# Altium footprint library 3D封装库.PcbLib: 716 footprints (part 38 of 45)
Each footprint in its own frame and in the unit in brackets; x right, y up, seen from the top. Pads: shape width x height; smd on the part's side, far side on the other; paste and mask are expansions set on the pad; w line width, h text height; cw(c..) or ccw(c..) is an arc to the next point about the centre after c.
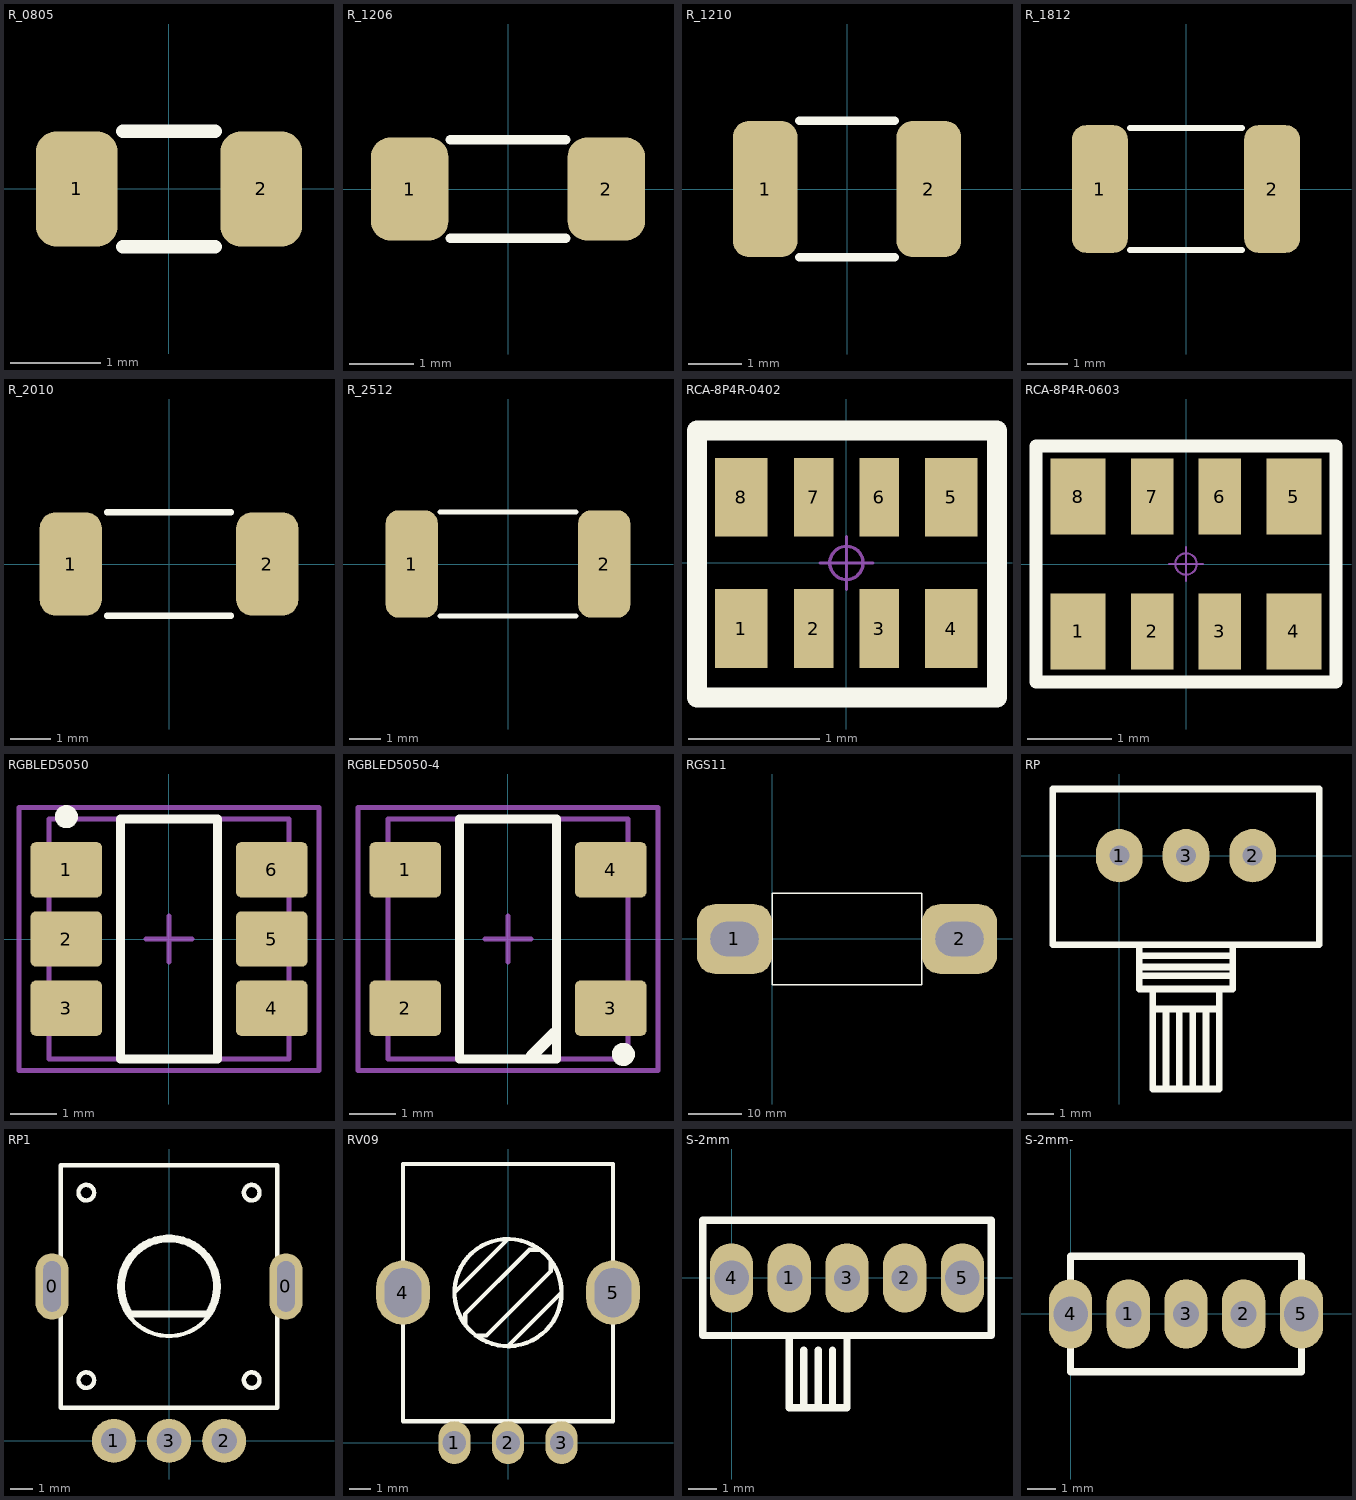
[diagram p37: the footprints below, top view; thin cyan lines are the x and y axes]

## R_0805 [mm]
pads (2):
  rrect50% 0.9x1.27 smd: 1(-1.016,0) 2(1.016,0)
Top Overlay:
  lines w0.152: -0.508,-0.635 0.508,-0.635 ; -0.508,0.635 0.508,0.635
3D body "R 0805.STEP": height 0.5, standoff -0.01, extent -1,-0.625 1,0.625

## R_1206 [mil]
pads (2):
  rrect50% 47.24x63 smd: 1(-60,0) 2(60,0)
Top Overlay:
  lines w6: -35,-30 35,-30 ; -35,30 35,30
3D body "R 1206.STEP": height 21.69, standoff -0.24, extent -62.99,-31.49 63,31.5

## R_1210 [mm]
pads (2):
  rrect50% 1.2x2.54 smd: 1(-1.524,0) 2(1.524,0)
Top Overlay:
  lines w0.152: -0.889,-1.27 0.889,-1.27 ; -0.889,1.27 0.889,1.27
3D body "R 1210.STEP": height 0.55, standoff -0.01, extent -1.6,-1.25 1.6,1.25

## R_1812 [mm]
pads (2):
  rrect50% 1.4x3.2 smd: 1(-2.159,0) 2(2.159,0)
Top Overlay:
  lines w0.152: -1.397,-1.524 1.397,-1.524 ; -1.397,1.524 1.397,1.524
3D body "R 1812.STEP": height 0.55, standoff -0.01, extent -2.25,-1.6 2.25,1.6

## R_2010 [mil]
pads (2):
  rrect50% 60x100 smd: 1(-95,0) 2(95,0)
Top Overlay:
  lines w6: -60,-50 60,-50 ; -60,50 60,50
3D body "R 2010.STEP": height 21.69, standoff -0.47, extent -98.42,-49.21 98.43,49.22

## R_2512 [mil]
pads (2):
  rrect50% 65x134 smd: 1(-120,0) 2(120,0)
Top Overlay:
  lines w6: -85,-65 85,-65 ; -85,65 85,65
3D body "R 2512.STEP": height 21.69, standoff -0.63, extent -125.98,-62.99 125.99,63

## RCA-8P4R-0402 [mm] "2mm*1mm*0.45mm(长*宽*厚)"
pads (8):
  rect 0.4x0.6 smd: 1(-0.8,-0.5) 4(0.8,-0.5) 5(0.8,0.5) 8(-0.8,0.5)
  rect 0.3x0.6 smd: 2(-0.25,-0.5) 3(0.25,-0.5) 6(0.25,0.5) 7(-0.25,0.5)
Top Overlay:
  lines w0.152: -1.139,-1.024 1.147,-1.024 1.147,1.008 -1.139,1.008 -1.139,-1.024
Mechanical 15:
  circle w0.025: c0,0 r0.127
  lines w0.025: -0.2,0 0.2,0 ; 0,-0.2 0,0.2
3D body "RCA-8P4R-0402.STEP": height 0.45, standoff 0, extent -1,-0.5 1,0.5

## RCA-8P4R-0603 [mm] "3.2mm*1.6mm*0.6mm(长*宽*厚)"
pads (8):
  rect 0.65x0.9 smd: 1(-1.28,-0.8) 4(1.28,-0.8) 5(1.28,0.8) 8(-1.28,0.8)
  rect 0.5x0.9 smd: 2(-0.4,-0.8) 3(0.4,-0.8) 6(0.4,0.8) 7(-0.4,0.8)
Top Overlay:
  lines w0.152: -1.778,-1.397 -1.778,1.397 1.778,1.397 1.778,-1.397 -1.778,-1.397
Mechanical 15:
  circle w0.025: c0,0 r0.127
  lines w0.025: -0.2,0 0.2,0 ; 0,-0.2 0,0.2
3D body "RCA-8P4R-0603.STEP": height 0.6, standoff 0, extent -1.6,-0.8 1.6,0.8

## RGBLED5050 [mm] "SOT23, 6-Leads, Body 5.2x5.6mm (max), Pitch 1.50mm, IPC Medium Density"
height 1.5
pads (6):
  rrect20% 1.55x1.2 smd: 1(-2.225,1.5) 2(-2.225,0) 3(-2.225,-1.5) 4(2.225,-1.5) 5(2.225,0) 6(2.225,1.5)
Top Overlay:
  circle w0.25: c-2.225,2.65 r0.125
  lines w0.2: -1.05,-2.6 -1.05,2.6 1.05,2.6 1.05,-2.6 -1.05,-2.6
Mechanical 13:
  lines w0.1: -2.6,-2.6 2.6,-2.6 2.6,2.6 -2.6,2.6 -2.6,-2.6
Mechanical 15:
  lines w0.1: -0.5,0 0.5,0 ; 0,-0.5 0,0.5 ; -3.25,-2.85 3.25,-2.85 3.25,2.85 -3.25,2.85 -3.25,-2.85
3D body "LED_5050.STEP": height 1.6, standoff 0, extent -2.65,-2.515 2.65,2.485

## RGBLED5050-4 [mm] "SOT23, 6-Leads, Body 5.2x5.6mm (max), Pitch 1.50mm, IPC Medium Density"
height 1.5
pads (4):
  rrect20% 1.55x1.2 smd: 1(-2.225,1.5) 2(-2.225,-1.5) 3(2.225,-1.5) 4(2.225,1.5)
Top Overlay:
  circle w0.25: c2.5,-2.5 r0.125
  lines w0.2: -1.05,-2.6 -1.05,2.6 1.05,2.6 1.05,-2.6 -1.05,-2.6
  lines w0.254: 0.508,-2.54 1.016,-2.032
Mechanical 13:
  lines w0.1: -2.6,-2.6 2.6,-2.6 2.6,2.6 -2.6,2.6 -2.6,-2.6
Mechanical 15:
  lines w0.1: -0.5,0 0.5,0 ; 0,-0.5 0,0.5 ; -3.25,-2.85 3.25,-2.85 3.25,2.85 -3.25,2.85 -3.25,-2.85
3D body "User Library-ws2812B-1.STEP": height 1.58, standoff 0.01, extent -2.7,-2.5 2.7,2.5

## RGS11 [mm]
pads (2):
  rrect50% 14x13 hole 6.5 slot 9 at 0 deg: 1(-7,0) 2(35,0)
Top Overlay:
  lines w0.254: 0,-8.5 0,8.5 28,8.5 28,-8.5 0,-8.5

## RP [mil]
pads (3):
  oval 70x80 hole 30: 1(0,0) 2(200,0) 3(100,0)
Top Overlay:
  lines w10: 30,-180 170,-180 ; 30,-166.93 170,-166.93 ; 30,-150 170,-150 ; 30,-133.86 30,-200 170,-200 170,-133.86 ; 50,-230 150,-230 ; 50,-200 50,-350 150,-350 150,-200 ; 70,-350 70,-230 ; 90,-350 90,-230 ; 110,-350 110,-230 ; 130,-350 130,-230 ; -100,-133.86 300,-133.86 300,100 -100,100 -100,-133.86
3D body: height 275.59, standoff 0, extent -98.43,-133.86 299.21,98.43

## RP1 [mm]
pads (5):
  oval 1.5x3 hole 0.8 slot 2.3 at 90 deg: 0(-5.3,7) 0(5.3,7)
  round 2 hole 1.15: 1(-2.5,0) 2(2.5,0) 3(0,0)
Top Overlay:
  circle w0.2: c0,7 r2.25
  circle w0.2: c-3.75,11.25 r0.354
  circle w0.2: c3.75,2.75 r0.354
  circle w0.2: c3.75,11.25 r0.354
  circle w0.2: c-3.75,2.75 r0.354
  lines w0.203: -4.9,1.5 -4.9,12.5 4.9,12.5 4.9,1.5 -4.9,1.5
  lines w0.3: -1.75,5.75 cw(c0,7) 1.75,5.75 -1.75,5.75

## RV09 [mm]
pads (5):
  oval 1.5x2 hole 1.1: 1(-2.5,0) 2(0,0) 3(2.5,0)
  oval 2.5x3 hole 1.7 slot 2.3 at 90 deg: 4(-4.9,7) 5(4.9,7)
Top Overlay:
  circle w0.2: c0,7 r2.5
  lines w0.2: -2.5,7 0,9.5 ; -2,5.5 -2,6 1,9 1.5,9 ; -1.5,5 -1,5 2,8 2,8.5 ; 0,4.5 2.5,7 ; 0,9.5 0,9.5 ; 2,8.5 2,8.5 ; -4.9,1 4.9,1 4.9,13 -4.9,13 -4.9,1

## S-2mm [mm]
pads (5):
  oval 1.5x2.4 hole 0.9: 1(2,0) 2(6,0) 3(4,0)
  oval 1.5x2.4 hole 1.2: 4(0,0) 5(8,0)
Top Overlay:
  lines w0.25: -1,-2 9,-2 9,2 -1,2 -1,-2
  lines w0.254: 2,-2 2,-4.5 4,-4.5 4,-2 ; 2.5,-4.5 2.5,-2.5 ; 3,-4.5 3,-2.5 ; 3.5,-4.5 3.5,-2.5
3D body: height 5, standoff 1, extent -1,-2 9,2
3D body: height 4, standoff 1.5, extent 2,-4.5 4,-2

## S-2mm- [mm]
pads (5):
  oval 1.5x2.4 hole 0.9: 1(2,0) 2(6,0) 3(4,0)
  oval 1.5x2.4 hole 1.2: 4(0,0) 5(8,0)
Top Overlay:
  lines w0.25: 0,-2 8.001,-2 8.001,2 0,2 0,-2